# Altium schematic symbol library Hydra_Ref_sch.SCHLIB: 791 symbols (part 4 of 5)
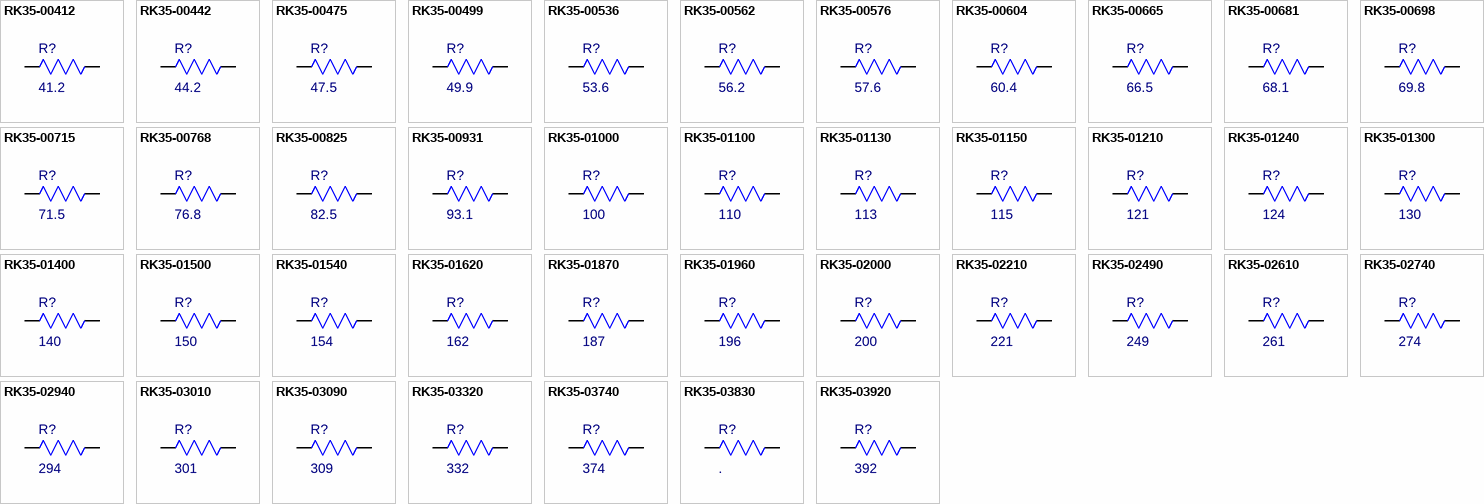
[diagram p25: symbols RK35-00412 to RK35-03920]

## RK35-02210
designator R?, comment value 221  (hidden comment: 221 OHMS; 1%; .1W; 100PPM; FILM; CHIP; 0402)
G_PN: RK35-02210; NoLoad: .; Approved: CL; MFGR: ANY; level: 1; ModifyDate: 2/28/13; M_PN: ANY; item_number: RK35-02210
footprint RES-0402-N (0402 Footprint)
pins: 1, 2

## RK35-02490
designator R?, comment value 249  (hidden comment: 249 OHMS; 1%; .1W; 100PPM; FILM; CHIP; 0402)
G_PN: RK35-02490; NoLoad: .; Approved: CL; MFGR: ANY; level: 1; ModifyDate: 02/22/12; M_PN: ANY; item_number: RK35-02490
footprint RES-0402-N (0402 Footprint)
pins: 1, 2

## RK35-02610
designator R?, comment value 261  (hidden comment: 261 OHMS; 1%; .1W; 100PPM; FILM; CHIP; 0402)
G_PN: RK35-02610; NoLoad: .; Approved: CL; MFGR: ANY; level: 1; ModifyDate: 02/13/13; M_PN: ANY; item_number: RK35-02610
footprint RES-0402-N (0402 Footprint)
pins: 1, 2

## RK35-02740
designator R?, comment value 274  (hidden comment: 274 OHMS; 1%; .1W; 100PPM; FILM; CHIP; 0402)
G_PN: RK35-02740; NoLoad: .; Approved: CL; MFGR: ANY; level: 1; ModifyDate: 6/28/13; M_PN: ANY; item_number: RK35-02740
footprint RES-0402-N (0402 Footprint)
pins: 1, 2

## RK35-02940
designator R?, comment value 294  (hidden comment: 294 OHMS; 1%; .1W; 100PPM; FILM; CHIP; 0402)
NoLoad: .; G_PN: RK35-02940; MFGR: ANY; Approved: CL; level: 1; ModifyDate: 02/22/12; M_PN: ANY; item_number: RK35-02940
footprint RES-0402-N (0402 Footprint)
pins: 1, 2

## RK35-03010
designator R?, comment value 301  (hidden comment: 301 OHMS; 1%; .1W; 100PPM; FILM; CHIP; 0402)
NoLoad: .; G_PN: RK35-03010; Approved: CL; MFGR: ANY; level: 1; ModifyDate: 4/12/12; M_PN: ANY; item_number: RK35-03010
footprint RES-0402-N (0402 Footprint)
pins: 1, 2

## RK35-03090
designator R?, comment value 309  (hidden comment: 309 OHMS; 1%; .1W; 100PPM; FILM; CHIP; 0402)
NoLoad: .; MFGR: ANY; Approved: CL; G_PN: RK35-03090; level: 1; ModifyDate: 02/22/12; M_PN: ANY; item_number: RK35-03090
footprint RES-0402-N (0402 Footprint)
pins: 1, 2

## RK35-03320
designator R?, comment value 332  (hidden comment: 332 OHMS; 1%; .1W; 100PPM; FILM; CHIP)
G_PN: RK35-03320; NoLoad: .; MFGR: ANY; Approved: CL; level: 1; ModifyDate: 4/9/12; M_PN: ANY; item_number: RK35-03320
footprint RES-0402-N (0402 Footprint)
pins: 1, 2

## RK35-03740
designator R?, comment value 374  (hidden comment: 374 OHMS; 1%; .1W; 100PPM; FILM; CHIP; 0402)
G_PN: RK35-03740; NoLoad: .; MFGR: ANY; Approved: CL; level: 1; ModifyDate: 4/11/12; M_PN: ANY; item_number: RK35-03740
footprint RES-0402-N (0402 Footprint)
pins: 1, 2

## RK35-03830
designator R?, comment NoLoad: .  (hidden comment: 383 OHMS; 1%; .1W; 100PPM; FILM; CHIP; 0402)
Value: 383; G_PN: RK35-03830; Approved: CL; MFGR: ANY; level: 1; ModifyDate: 4/11/12; M_PN: ANY; item_number: RK35-03830
footprint RES-0402-N (0402 Footprint)
pins: 1, 2

## RK35-03920
designator R?, comment value 392  (hidden comment: 392 OHMS; 1%; .1W; 100PPM; FILM; CHIP; 0402)
G_PN: RK35-03920; NoLoad: .; MFGR: ANY; Approved: CL; level: 1; ModifyDate: 02/22/12; M_PN: ANY; item_number: RK35-03920
footprint RES-0402-N (0402 Footprint)
pins: 1, 2

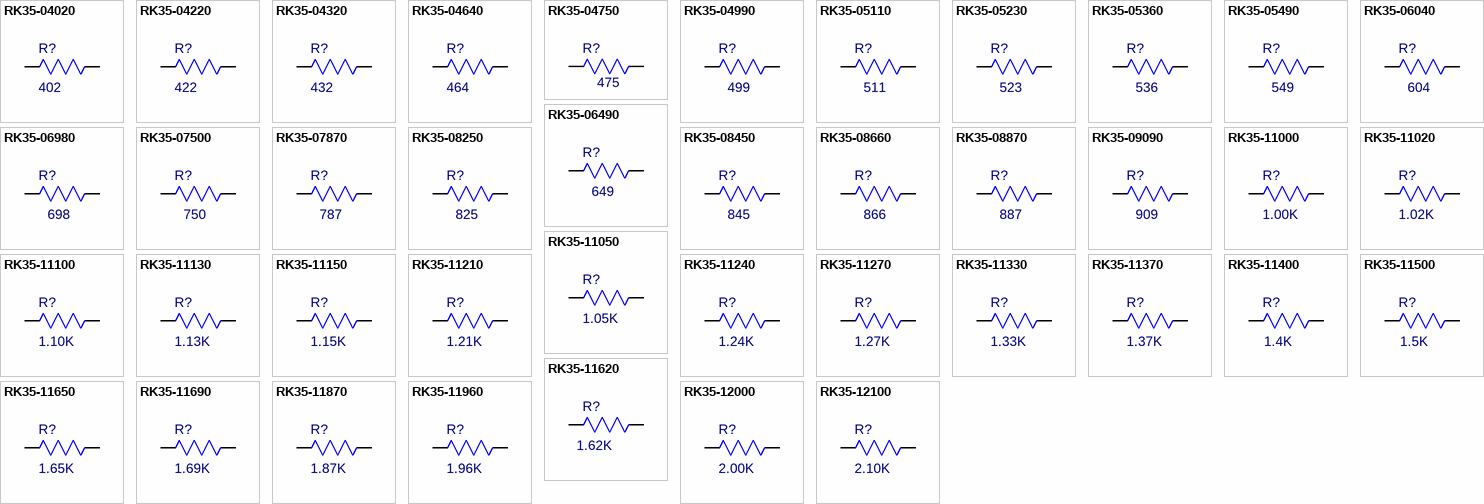
[diagram p14: symbols RK35-04020 to RK35-12100]

## RK35-04020
designator R?, comment value 402  (hidden comment: 402 OHMS; 1%; .1W; 100PPM; FILM; CHIP; 0402)
G_PN: RK35-04020; NoLoad: .; MFGR: ANY; Approved: CL; level: 1; ModifyDate: 4/11/12; M_PN: ANY; item_number: RK35-04020
footprint RES-0402-N (0402 Footprint)
pins: 1, 2

## RK35-04220
designator R?, comment value 422  (hidden comment: 422 OHMS; 1%; .1W; 100PPM; FILM; CHIP; 0402)
NoLoad: .; G_PN: RK35-04220; MFGR: ANY; Approved: CL; level: 1; ModifyDate: 02/22/12; M_PN: ANY; item_number: RK35-04220
footprint RES-0402-N (0402 Footprint)
pins: 1, 2

## RK35-04320
designator R?, comment value 432  (hidden comment: 432 OHMS; 1%; .1W; 100PPM; FILM; CHIP; 0402)
G_PN: RK35-04320; NoLoad: .; MFGR: ANY; Approved: CL; level: 1; ModifyDate: 02/22/12; M_PN: ANY; item_number: RK35-04320
footprint RES-0402-N (0402 Footprint)
pins: 1, 2

## RK35-04640
designator R?, comment value 464  (hidden comment: 464 OHMS; 1%; .1W; 100PPM; FILM; CHIP; 0402)
G_PN: RK35-04640; NoLoad: .; MFGR: ANY; Approved: CL; level: 1; ModifyDate: 4/26/13; M_PN: ANY; item_number: RK35-04640
footprint RES-0402-N (0402 Footprint)
pins: 1, 2

## RK35-04750
designator R?, comment value 475  (hidden comment: 475 OHMS; 1%; .1W; 100PPM; FILM; CHIP; 0402)
G_PN: RK35-04750; NoLoad: .; MFGR: ANY; Approved: CL; level: 1; ModifyDate: 02/22/12; M_PN: ANY; item_number: RK35-04750
footprint RES-0402-N (0402 Footprint)
pins: 1, 2

## RK35-04990
designator R?, comment value 499  (hidden comment: 499 OHMS; 1%; .1W; 100PPM; FILM; CHIP; 0402)
G_PN: RK35-04990; NoLoad: .; Approved: CL; MFGR: ANY; level: 1; ModifyDate: 02/22/12; M_PN: ANY; item_number: RK35-04990
footprint RES-0402-N (0402 Footprint)
pins: 1, 2

## RK35-05110
designator R?, comment value 511  (hidden comment: 511 OHMS; 1%; .1W; 100PPM; FILM; CHIP; 0402)
G_PN: RK35-05110; NoLoad: .; MFGR: ANY; Approved: CL; level: 1; ModifyDate: 4/23/13; M_PN: ANY; item_number: RK35-05110
footprint RES-0402-N (0402 Footprint)
pins: 1, 2

## RK35-05230
designator R?, comment value 523  (hidden comment: 523 OHMS; 1%; .1W; 100PPM; FILM; CHIP; 0402)
G_PN: RK35-05230; NoLoad: .; MFGR: ANY; Approved: CL; level: 1; ModifyDate: 2/13/13; M_PN: ANY; item_number: RK35-05230
footprint RES-0402-N (0402 Footprint)
pins: 1, 2

## RK35-05360
designator R?, comment value 536  (hidden comment: 536 OHMS; 1%; .1W; 100PPM; FILM; CHIP; 0402)
G_PN: RK35-05360; NoLoad: .; MFGR: ANY; Approved: CL; level: 1; ModifyDate: 9/28/15; M_PN: ANY; item_number: RK35-05360
footprint RES-0402-N (0402 Footprint)
pins: 1, 2

## RK35-05490
designator R?, comment value 549  (hidden comment: 549 OHMS; 1%; .1W; 100PPM; FILM; CHIP; 0402)
G_PN: RK35-05490; NoLoad: .; MFGR: ANY; Approved: CL; level: 1; ModifyDate: 5/7/12; M_PN: ANY; item_number: RK35-05490
footprint RES-0402-N (0402 Footprint)
pins: 1, 2

## RK35-06040
designator R?, comment value 604  (hidden comment: 604 OHMS; 1%; .1W; 100PPM; FILM; CHIP; 0402)
G_PN: RK35-06040; NoLoad: .; MFGR: ANY; Approved: CL; level: 1; ModifyDate: 4/23/13; M_PN: ANY; item_number: RK35-06040
footprint RES-0402-N (0402 Footprint)
pins: 1, 2

## RK35-06490
designator R?, comment value 649  (hidden comment: 649 OHMS; 1%; .1W; 100PPM; FILM; CHIP; 0402)
G_PN: RK35-06490; NoLoad: .; MFGR: ANY; Approved: CL; level: 1; ModifyDate: 9/5/14; M_PN: ANY; item_number: RK35-06490
footprint RES-0402-N (0402 Footprint)
pins: 1, 2

## RK35-06980
designator R?, comment value 698  (hidden comment: 698 OHMS; 1%; .1W; 100PPM; FILM; CHIP; 0402)
G_PN: RK35-06980; NoLoad: .; MFGR: ANY; Approved: CL; level: 1; ModifyDate: 02/22/12; M_PN: ANY; item_number: RK35-06980
footprint RES-0402-N (0402 Footprint)
pins: 1, 2

## RK35-07500
designator R?, comment value 750  (hidden comment: 750 OHMS;.1W;1%;100PPM;FILM CHIP;0402)
G_PN: RK35-07500; NoLoad: .; MFGR: ANY; Approved: CL; level: 1; M_PN: ANY; ModifyDate: 4/11/12; item_number: RK35-07500
footprint RES-0402-N (0402 Footprint)
pins: 1, 2

## RK35-07870
designator R?, comment value 787  (hidden comment: 787 OHMS;.1W;1%;100PPM;FILM CHIP;0402)
G_PN: RK35-07870; NoLoad: .; MFGR: ANY; Approved: CL; level: 1; M_PN: ANY; ModifyDate: 2/22/13; item_number: RK35-07870
footprint RES-0402-N (0402 Footprint)
pins: 1, 2

## RK35-08250
designator R?, comment value 825  (hidden comment: 825 OHMS; 1%; .1W; 100PPM; FILM; CHIP; 0402)
G_PN: RK35-08250; NoLoad: .; Approved: CL; MFGR: ANY; level: 1; ModifyDate: 02/22/12; M_PN: ANY; item_number: RK35-08250
footprint RES-0402-N (0402 Footprint)
pins: 1, 2

## RK35-08450
designator R?, comment value 845  (hidden comment: 845 OHMS; 1%; .1W; 100PPM; FILM; CHIP; 0402)
G_PN: RK35-08450; NoLoad: .; Approved: CL; MFGR: ANY; level: 1; ModifyDate: 4/23/13; M_PN: ANY; item_number: RK35-08450
footprint RES-0402-N (0402 Footprint)
pins: 1, 2

## RK35-08660
designator R?, comment value 866  (hidden comment: 866 OHMS; 1%; .1W; 100PPM; FILM; CHIP; 0402)
NoLoad: .; G_PN: RK35-08660; MFGR: ANY; Approved: CL; level: 1; ModifyDate: 02/22/12; M_PN: ANY; item_number: RK35-08660
footprint RES-0402-N (0402 Footprint)
pins: 1, 2

## RK35-08870
designator R?, comment value 887  (hidden comment: 887 OHMS; 1%; .1W; 100PPM; FILM; CHIP; 0402)
G_PN: RK35-08870; NoLoad: .; Approved: CL; MFGR: ANY; level: 1; ModifyDate: 02/22/12; M_PN: ANY; item_number: RK35-08870
footprint RES-0402-N (0402 Footprint)
pins: 1, 2

## RK35-09090
designator R?, comment value 909  (hidden comment: 909 OHMS; 1%; .1W; 100PPM; FILM; CHIP; 0402)
G_PN: RK35-09090; NoLoad: .; Approved: CL; MFGR: ANY; level: 1; ModifyDate: 3/25/13; M_PN: ANY; item_number: RK35-09090
footprint RES-0402-N (0402 Footprint)
pins: 1, 2

## RK35-11000
designator R?, comment value 1.00K  (hidden comment: 1.0K OHMS;.06W;1%;200PPM;FILM;CHIP;0402)
G_PN: RK35-11000; Approved: CL; NoLoad: .; MFGR: ANY; level: 1; ModifyDate: 02/22/12; M_PN: ANY; item_number: RK35-11000
footprint RES-0402-N (0402 Footprint)
pins: 1, 2

## RK35-11020
designator R?, comment value 1.02K  (hidden comment: 1.02K OHMS;.06W;1%;100PPM;FILM;CHIP;0402)
G_PN: RK35-11020; NoLoad: .; Approved: CL; MFGR: ANY; level: 1; ModifyDate: 5/9/13; M_PN: ANY; item_number: RK35-11020
footprint RES-0402-N (0402 Footprint)
pins: 1, 2

## RK35-11050
designator R?, comment value 1.05K  (hidden comment: 1.05K OHMS;.06W;1%;200PPM;FILM;CHIP;0402)
G_PN: RK35-11050; NoLoad: .; Approved: CL; MFGR: ANY; level: 1; ModifyDate: 03/14/13; M_PN: ANY; item_number: RK35-11050
footprint RES-0402-N (0402 Footprint)
pins: 1, 2

## RK35-11100
designator R?, comment value 1.10K  (hidden comment: 1.10K OHMS;.06W;1%;100PPM;FILM;CHIP;0402)
G_PN: RK35-11100; NoLoad: .; Approved: CL; MFGR: ANY; level: 1; ModifyDate: 5/13/13; M_PN: ANY; item_number: RK35-11100
footprint RES-0402-N (0402 Footprint)
pins: 1, 2

## RK35-11130
designator R?, comment value 1.13K  (hidden comment: 1.13K OHMS;.06W;1%;200PPM;FILM;CHIP;0402)
G_PN: RK35-11130; NoLoad: .; Approved: CL; MFGR: ANY; level: 1; ModifyDate: 5/8/13; M_PN: ANY; item_number: RK35-11130
footprint RES-0402-N (0402 Footprint)
pins: 1, 2

## RK35-11150
designator R?, comment value 1.15K  (hidden comment: 1.15K OHMS;.06W;1%;200PPM;FILM;CHIP;0402)
G_PN: RK35-11150; NoLoad: .; Approved: CL; MFGR: ANY; level: 1; ModifyDate: 5/8/13; M_PN: ANY; item_number: RK35-11150
footprint RES-0402-N (0402 Footprint)
pins: 1, 2

## RK35-11210
designator R?, comment value 1.21K  (hidden comment: 1.21K OHMS;.06W;1%;200PPM;FILM;CHIP;0402)
G_PN: RK35-11210; NoLoad: .; Approved: CL; MFGR: ANY; level: 1; ModifyDate: 02/22/13; M_PN: ANY; item_number: RK35-11210
footprint RES-0402-N (0402 Footprint)
pins: 1, 2

## RK35-11240
designator R?, comment value 1.24K  (hidden comment: 1.24K Ohms;.06W;1%;±100PPM;CHIP RES;0402)
G_PN: RK35-11240; NoLoad: .; Approved: CL; MFGR: ANY; level: 1; ModifyDate: 5/8/13; M_PN: ANY; item_number: RK35-11240
footprint RES-0402-N (0402 Footprint)
pins: 1, 2

## RK35-11270
designator R?, comment value 1.27K  (hidden comment: 1.27K OHMS;.06W;1%;200PPM;FILM;CHIP;0402)
G_PN: RK35-11270; NoLoad: .; Approved: CL; MFGR: ANY; level: 1; ModifyDate: 02/22/13; M_PN: ANY; item_number: RK35-11270
footprint RES-0402-N (0402 Footprint)
pins: 1, 2

## RK35-11330
designator R?, comment value 1.33K  (hidden comment: 1.33K OHMS;.06W;1%;200PPM;FILM;CHIP;0402)
G_PN: RK35-11330; NoLoad: .; Approved: CL; MFGR: ANY; level: 1; ModifyDate: 02/22/12; M_PN: ANY; item_number: RK35-11330
footprint RES-0402-N (0402 Footprint)
pins: 1, 2

## RK35-11370
designator R?, comment value 1.37K  (hidden comment: 1.37K OHMS;.06W;1%;200PPM;FILM;CHIP;0402)
G_PN: RK35-11370; NoLoad: .; Approved: CL; MFGR: ANY; level: 1; ModifyDate: 02/04/13; M_PN: ANY; item_number: RK35-11370
footprint RES-0402-N (0402 Footprint)
pins: 1, 2

## RK35-11400
designator R?, comment value 1.4K  (hidden comment: 1.40K Ohms;.06W;1%;±100PPM;CHIP RES;0402)
G_PN: RK35-11400; Approved: CL; NoLoad: .; MFGR: ANY; level: 1; ModifyDate: 5/8/13; M_PN: ANY; item_number: RK35-11400
footprint RES-0402-N (0402 Footprint)
pins: 1, 2

## RK35-11500
designator R?, comment value 1.5K  (hidden comment: 1.50K Ohms;.06W;1%;±100PPM;CHIP RES;0402)
G_PN: RK35-11500; Approved: CL; NoLoad: .; MFGR: ANY; level: 1; ModifyDate: 4/11/12; M_PN: ANY; item_number: RK35-11500
footprint RES-0402-N (0402 Footprint)
pins: 1, 2

## RK35-11620
designator R?, comment value 1.62K  (hidden comment: 1.62K Ohms;.06W;1%;±100PPM;CHIP RES;0402)
G_PN: RK35-11620; Approved: CL; NoLoad: .; MFGR: ANY; level: 1; ModifyDate: 02/22/12; M_PN: ANY; item_number: RK35-11620
footprint RES-0402-N (0402 Footprint)
pins: 1, 2

## RK35-11650
designator R?, comment value 1.65K  (hidden comment: 1.65K Ohms;.06W;1%;±100PPM;CHIP RES;0402)
G_PN: RK35-11650; Approved: CL; NoLoad: .; MFGR: ANY; level: 1; ModifyDate: 5/14/12; M_PN: ANY; item_number: RK35-11650
footprint RES-0402-N (0402 Footprint)
pins: 1, 2

## RK35-11690
designator R?, comment value 1.69K  (hidden comment: 1.69K Ohms;.06W;1%;±100PPM;CHIP RES;0402)
G_PN: RK35-11690; Approved: CL; NoLoad: .; MFGR: ANY; level: 1; ModifyDate: 5/13/13; M_PN: ANY; item_number: RK35-11690
footprint RES-0402-N (0402 Footprint)
pins: 1, 2

## RK35-11870
designator R?, comment value 1.87K  (hidden comment: 1.87K Ohms;.06W;1%;±100PPM;CHIP RES;0402)
G_PN: RK35-11870; Approved: CL; NoLoad: .; MFGR: ANY; level: 1; ModifyDate: 5/13/13; M_PN: ANY; item_number: RK35-11870
footprint RES-0402-N (0402 Footprint)
pins: 1, 2

## RK35-11960
designator R?, comment value 1.96K  (hidden comment: 1.96K Ohms;.06W;1%;±100PPM;CHIP RES;0402)
G_PN: RK35-11960; Approved: CL; NoLoad: .; MFGR: ANY; level: 1; ModifyDate: 5/8/13; M_PN: ANY; item_number: RK35-11960
footprint RES-0402-N (0402 Footprint)
pins: 1, 2

## RK35-12000
designator R?, comment value 2.00K  (hidden comment: 2.00K OHMS;.06W;1%;200PPM;FILM;CHIP;0402)
G_PN: RK35-12000; NoLoad: .; MFGR: ANY; Approved: CL; level: 1; ModifyDate: 02/22/12; M_PN: ANY; item_number: RK35-12000
footprint RES-0402-N (0402 Footprint)
pins: 1, 2

## RK35-12100
designator R?, comment value 2.10K  (hidden comment: 2.10K OHMS;.06W;1%;100PPM;FILM;CHIP;0402)
G_PN: RK35-12100; NoLoad: .; MFGR: ANY; Approved: CL; level: 1; ModifyDate: 5/7/12; M_PN: ANY; item_number: RK35-12100
footprint RES-0402-N (0402 Footprint)
pins: 1, 2

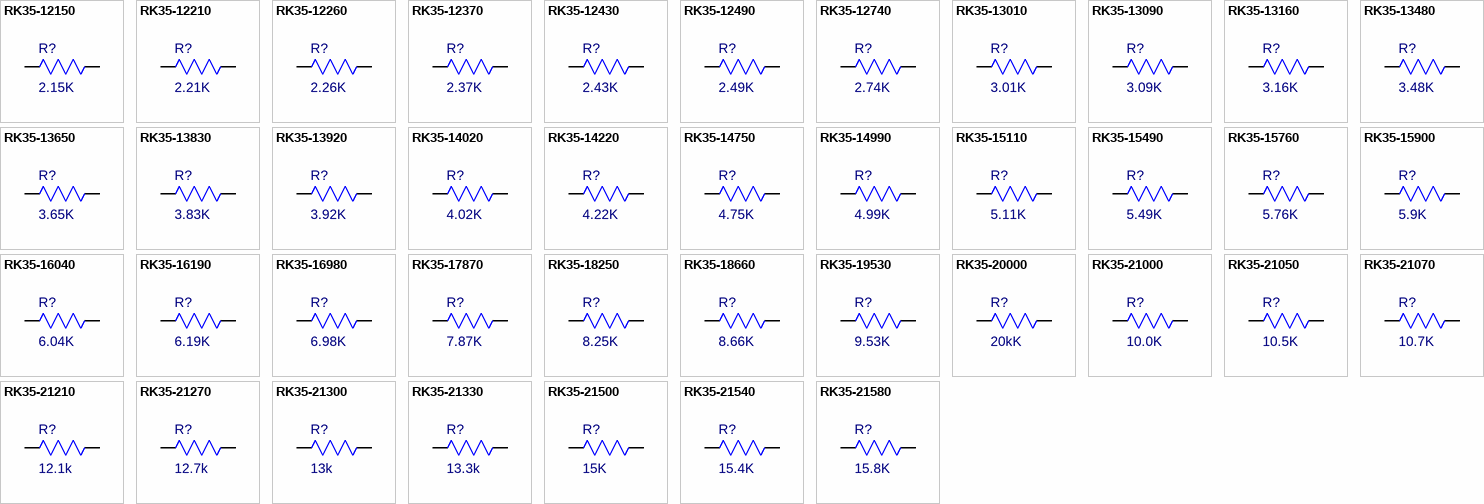
[diagram p15: symbols RK35-12150 to RK35-21580]

## RK35-12150
designator R?, comment value 2.15K  (hidden comment: 2.15K OHMS;.06W;1%;200PPM;FILM;CHIP;0402)
G_PN: RK35-12150; NoLoad: .; MFGR: ANY; Approved: CL; level: 1; ModifyDate: 5/7/12; M_PN: ANY; item_number: RK35-12150
footprint RES-0402-N (0402 Footprint)
pins: 1, 2

## RK35-12210
designator R?, comment value 2.21K  (hidden comment: 2.21K OHMS;.06W;1%;200PPM;FILM;CHIP;0402)
G_PN: RK35-12210; NoLoad: .; MFGR: ANY; Approved: CL; level: 1; ModifyDate: 2/22/13; M_PN: ANY; item_number: RK35-12210
footprint RES-0402-N (0402 Footprint)
pins: 1, 2

## RK35-12260
designator R?, comment value 2.26K  (hidden comment: 2.26K OHMS;.06W;1%;200PPM;FILM;CHIP;0402)
G_PN: RK35-12260; NoLoad: .; MFGR: ANY; Approved: CL; level: 1; ModifyDate: 5/8/13; M_PN: ANY; item_number: RK35-12260
footprint RES-0402-N (0402 Footprint)
pins: 1, 2

## RK35-12370
designator R?, comment value 2.37K  (hidden comment: 2.37K OHMS;.06W;1%;200PPM;FILM;CHIP;0402)
G_PN: RK35-12370; NoLoad: .; MFGR: ANY; Approved: CL; level: 1; ModifyDate: 02/23/13; M_PN: ANY; item_number: RK35-12370
footprint RES-0402-N (0402 Footprint)
pins: 1, 2

## RK35-12430
designator R?, comment value 2.43K  (hidden comment: 2.43K OHMS;.06W;1%;200PPM;FILM;CHIP;0402)
G_PN: RK35-12430; NoLoad: .; MFGR: ANY; Approved: CL; level: 1; ModifyDate: 5/8/13; M_PN: ANY; item_number: RK35-12430
footprint RES-0402-N (0402 Footprint)
pins: 1, 2

## RK35-12490
designator R?, comment value 2.49K  (hidden comment: 2.49K OHMS;.06W;1%;200PPM;FILM;CHIP;0402)
G_PN: RK35-12490; NoLoad: .; MFGR: ANY; Approved: CL; level: 1; ModifyDate: 02/22/12; M_PN: ANY; item_number: RK35-12490
footprint RES-0402-N (0402 Footprint)
pins: 1, 2

## RK35-12740
designator R?, comment value 2.74K  (hidden comment: 2.74K OHMS;.06W;1%;100PPM;FILM;CHIP;0402)
G_PN: RK35-12740; NoLoad: .; MFGR: ANY; Approved: CL; level: 1; ModifyDate: 5/10/13; M_PN: ANY; item_number: RK35-12740
footprint RES-0402-N (0402 Footprint)
pins: 1, 2

## RK35-13010
designator R?, comment value 3.01K  (hidden comment: 3.01K OHMS;.06W;1%;200PPM;FILM;CHIP;0402)
G_PN: RK35-13010; Approved: CL; NoLoad: .; MFGR: ANY; level: 1; ModifyDate: 02/22/12; M_PN: ANY; item_number: RK35-13010
footprint RES-0402-N (0402 Footprint)
pins: 1, 2

## RK35-13090
designator R?, comment value 3.09K  (hidden comment: 3.09K OHMS;.06W;1%;200PPM;FILM;CHIP;0402)
G_PN: RK35-13090; Approved: CL; NoLoad: .; MFGR: ANY; level: 1; ModifyDate: 4/25/13; M_PN: ANY; item_number: RK35-13090
footprint RES-0402-N (0402 Footprint)
pins: 1, 2

## RK35-13160
designator R?, comment value 3.16K  (hidden comment: 3.16K OHMS;.06W;1%;200PPM;FILM;CHIP;0402)
G_PN: RK35-13160; Approved: CL; NoLoad: .; MFGR: ANY; level: 1; ModifyDate: 02/26/13; M_PN: ANY; item_number: RK35-13160
footprint RES-0402-N (0402 Footprint)
pins: 1, 2

## RK35-13480
designator R?, comment value 3.48K  (hidden comment: 3.48K OHMS;.06W;1%;200PPM;FILM;CHIP;0402)
G_PN: RK35-13480; Approved: CL; NoLoad: .; MFGR: ANY; level: 1; ModifyDate: 02/22/12; M_PN: ANY; item_number: RK35-13480
footprint RES-0402-N (0402 Footprint)
pins: 1, 2

## RK35-13650
designator R?, comment value 3.65K  (hidden comment: 3.65K OHMS;.06W;1%;200PPM;FILM;CHIP;0402)
G_PN: RK35-13650; Approved: CL; NoLoad: .; MFGR: ANY; level: 1; ModifyDate: 02/22/12; M_PN: ANY; item_number: RK35-13650
footprint RES-0402-N (0402 Footprint)
pins: 1, 2

## RK35-13830
designator R?, comment value 3.83K  (hidden comment: 3.83K OHMS;.06W;1%;100PPM;FILM;CHIP;0402)
G_PN: RK35-13830; NoLoad: .; MFGR: ANY; Approved: CL; level: 1; ModifyDate: 5/10/13; M_PN: ANY; item_number: RK35-13830
footprint RES-0402-N (0402 Footprint)
pins: 1, 2

## RK35-13920
designator R?, comment value 3.92K  (hidden comment: 3.92K OHMS;.06W;1%;200PPM;FILM;CHIP;0402)
G_PN: RK35-13920; NoLoad: .; MFGR: ANY; Approved: CL; level: 1; ModifyDate: 4/11/12; M_PN: ANY; item_number: RK35-13920
footprint RES-0402-N (0402 Footprint)
pins: 1, 2

## RK35-14020
designator R?, comment value 4.02K  (hidden comment: 4.02 K OHMS;.06W;1%;200PPM;FILM;CHIP;0402)
G_PN: RK35-14020; NoLoad: .; MFGR: ANY; Approved: CL; level: 1; ModifyDate: 3/5/13; M_PN: ANY; item_number: RK35-14020
footprint RES-0402-N (0402 Footprint)
pins: 1, 2

## RK35-14220
designator R?, comment value 4.22K  (hidden comment: 4.22K OHMS;.06W;1%;200PPM;FILM;CHIP;0402)
G_PN: RK35-14220; NoLoad: .; Approved: CL; MFGR: ANY; level: 1; ModifyDate: 02/26/13; M_PN: ANY; item_number: RK35-14220
footprint RES-0402-N (0402 Footprint)
pins: 1, 2

## RK35-14750
designator R?, comment value 4.75K  (hidden comment: 4.75K OHMS;.06W;1%;200PPM;FILM;CHIP;0402)
G_PN: RK35-14750; NoLoad: .; Approved: CL; MFGR: ANY; level: 1; ModifyDate: 02/22/12; M_PN: ANY; item_number: RK35-14750
footprint RES-0402-N (0402 Footprint)
pins: 1, 2

## RK35-14990
designator R?, comment value 4.99K  (hidden comment: 4.99K OHMS;.06W;1%;200PPM;FILM;CHIP;0402)
G_PN: RK35-14990; Approved: CL; NoLoad: .; MFGR: ANY; level: 1; ModifyDate: 4/11/12; M_PN: ANY; item_number: RK35-14990
footprint RES-0402-N (0402 Footprint)
pins: 1, 2

## RK35-15110
designator R?, comment value 5.11K  (hidden comment: 5.11K Ohms;.06W;1%;±100PPM;CHIP RES;0402)
G_PN: RK35-15110; NoLoad: .; Approved: CL; MFGR: ANY; level: 1; ModifyDate: 02/04/12; M_PN: ANY; item_number: RK35-15110
footprint RES-0402-N (0402 Footprint)
pins: 1, 2

## RK35-15490
designator R?, comment value 5.49K  (hidden comment: 5.49K OHMS;.06W;1%;100PPM;FILM;CHIP;0402)
G_PN: RK35-15490; NoLoad: .; Approved: CL; MFGR: ANY; level: 1; ModifyDate: 5/9/14; M_PN: ANY; item_number: RK35-15490
footprint RES-0402-N (0402 Footprint)
pins: 1, 2

## RK35-15760
designator R?, comment value 5.76K  (hidden comment: 5.76K OHMS;.06W;1%;200PPM;FILM;CHIP;0402)
G_PN: RK35-15760; NoLoad: .; Approved: CL; MFGR: ANY; level: 1; ModifyDate: 02/04/12; M_PN: ANY; item_number: RK35-15760
footprint RES-0402-N (0402 Footprint)
pins: 1, 2

## RK35-15900
designator R?, comment value 5.9K  (hidden comment: 5.9K OHMS;.06W;1%;200PPM;FILM;CHIP;0402)
G_PN: RK35-15900; NoLoad: .; Approved: CL; MFGR: ANY; level: 1; ModifyDate: 02/22/12; M_PN: ANY; item_number: RK35-15900
footprint RES-0402-N (0402 Footprint)
pins: 1, 2

## RK35-16040
designator R?, comment value 6.04K  (hidden comment: 6.04K OHMS;.06W;1%;200PPM;FILM;CHIP;0402)
G_PN: RK35-16040; Approved: CL; NoLoad: .; MFGR: ANY; level: 1; ModifyDate: 4/11/12; M_PN: ANY; item_number: RK35-16040
footprint RES-0402-N (0402 Footprint)
pins: 1, 2

## RK35-16190
designator R?, comment value 6.19K  (hidden comment: 6.19K OHMS;.06W;1%;200PPM;FILM;CHIP;0402)
G_PN: RK35-16190; NoLoad: .; Approved: CL; MFGR: ANY; level: 1; ModifyDate: 02/22/12; M_PN: ANY; item_number: RK35-16190
footprint RES-0402-N (0402 Footprint)
pins: 1, 2

## RK35-16980
designator R?, comment value 6.98K  (hidden comment: 6.98K OHMS;.06W;1%;100PPM;FILM;CHIP;0402)
G_PN: RK35-16980; NoLoad: .; Approved: CL; MFGR: ANY; level: 1; ModifyDate: 5/15/13; M_PN: ANY; item_number: RK35-16980
footprint RES-0402-N (0402 Footprint)
pins: 1, 2

## RK35-17870
designator R?, comment value 7.87K  (hidden comment: 7.87K OHMS;.06W;1%;100PPM;FILM;CHIP;0402)
G_PN: RK35-17870; NoLoad: .; Approved: CL; MFGR: ANY; level: 1; ModifyDate: 9/28/15; M_PN: ANY; item_number: RK35-17870
footprint RES-0402-N (0402 Footprint)
pins: 1, 2

## RK35-18250
designator R?, comment value 8.25K  (hidden comment: 8.25K OHMS;.06W;1%;200PPM;FILM;CHIP;0402)
G_PN: RK35-18250; Approved: CL; NoLoad: .; MFGR: ANY; level: 1; ModifyDate: 4/11/12; M_PN: ANY; item_number: RK35-18250
footprint RES-0402-N (0402 Footprint)
pins: 1, 2

## RK35-18660
designator R?, comment value 8.66K  (hidden comment: 8.66K OHMS;.06W;1%;200PPM;FILM;CHIP;0402)
G_PN: RK35-18660; Approved: CL; NoLoad: .; MFGR: ANY; level: 1; ModifyDate: 6/10/13; M_PN: ANY; item_number: RK35-18660
footprint RES-0402-N (0402 Footprint)
pins: 1, 2

## RK35-19530
designator R?, comment value 9.53K  (hidden comment: 9.53K OHMS;.06W;1%;200PPM;FILM;CHIP;0402)
G_PN: RK35-19530; NoLoad: .; Approved: CL; MFGR: ANY; level: 1; ModifyDate: 02/22/12; M_PN: ANY; item_number: RK35-19530
footprint RES-0402-N (0402 Footprint)
pins: 1, 2

## RK35-20000
designator R?, comment value 20kK  (hidden comment: 18.2K OHMS;.06W;1%;100PPM;FILM;CHIP;0402)
G_PN: RK35-20000; Approved: CL; NoLoad: .; MFGR: ANY; level: 1; ModifyDate: 6/6/13; M_PN: ANY; item_number: RK35-20000
footprint RES-0402-N (0402 Footprint)
pins: 1, 2

## RK35-21000
designator R?, comment value 10.0K  (hidden comment: 10.0K OHMS;.06W;1%;200PPM;FILM;CHIP;0402)
G_PN: RK35-21000; Approved: CL; NoLoad: .; MFGR: ANY; level: 1; ModifyDate: 02/22/12; M_PN: ANY; item_number: RK35-21000
footprint RES-0402-N (0402 Footprint)
pins: 1, 2

## RK35-21050
designator R?, comment value 10.5K  (hidden comment: 10.5K OHMS;.06W;1%;200PPM;FILM;CHIP;0402)
G_PN: RK35-21050; Approved: CL; NoLoad: .; MFGR: ANY; level: 1; ModifyDate: 5/6/13; M_PN: ANY; item_number: RK35-21050
footprint RES-0402-N (0402 Footprint)
pins: 1, 2

## RK35-21070
designator R?, comment value 10.7K  (hidden comment: 10.7K OHMS;.06W;1%;100PPM;FILM;CHIP;0402)
G_PN: RK35-21070; Approved: CL; NoLoad: .; MFGR: ANY; level: 1; ModifyDate: 6/10/13; M_PN: ANY; item_number: RK35-21070
footprint RES-0402-N (0402 Footprint)
pins: 1, 2

## RK35-21210
designator R?, comment value 12.1k  (hidden comment: 12.1K OHMS;.06W;1%;200PPM;FILM;CHIP;0402)
G_PN: RK35-21210; Approved: CL; NoLoad: .; MFGR: ANY; level: 1; ModifyDate: 4/26/13; M_PN: ANY; item_number: RK35-21210
footprint RES-0402-N (0402 Footprint)
pins: 1, 2

## RK35-21270
designator R?, comment value 12.7k  (hidden comment: 12.7K OHMS;.06W;1%;200PPM;FILM;CHIP;0402)
G_PN: RK35-21270; Approved: CL; NoLoad: .; MFGR: ANY; level: 1; ModifyDate: 4/23/13; M_PN: ANY; item_number: RK35-21270
footprint RES-0402-N (0402 Footprint)
pins: 1, 2

## RK35-21300
designator R?, comment value 13k  (hidden comment: 13K OHMS;.06W;1%;200PPM;FILM;CHIP;0402)
G_PN: RK35-21300; Approved: CL; NoLoad: .; MFGR: ANY; level: 1; ModifyDate: 4/23/13; M_PN: ANY; item_number: RK35-21300
footprint RES-0402-N (0402 Footprint)
pins: 1, 2

## RK35-21330
designator R?, comment value 13.3k  (hidden comment: 13.3K OHMS;.06W;1%;200PPM;FILM;CHIP;0402)
G_PN: RK35-21330; Approved: CL; NoLoad: .; MFGR: ANY; level: 1; ModifyDate: 4/30/13; M_PN: ANY; item_number: RK35-21330
footprint RES-0402-N (0402 Footprint)
pins: 1, 2

## RK35-21500
designator R?, comment value 15K  (hidden comment: 15K OHMS;.06W;1%;200PPM;FILM;CHIP;0402)
G_PN: RK35-21500; Approved: CL; NoLoad: .; MFGR: ANY; level: 1; ModifyDate: 02/26/13; M_PN: ANY; item_number: RK35-21500
footprint RES-0402-N (0402 Footprint)
pins: 1, 2

## RK35-21540
designator R?, comment value 15.4K  (hidden comment: 15.4K OHMS;.06W;1%;200PPM;FILM;CHIP;0402)
G_PN: RK35-21540; Approved: CL; NoLoad: .; MFGR: ANY; level: 1; ModifyDate: 02/26/13; M_PN: ANY; item_number: RK35-21540
footprint RES-0402-N (0402 Footprint)
pins: 1, 2

## RK35-21580
designator R?, comment value 15.8K  (hidden comment: 15.8K OHMS;.06W;1%;200PPM;FILM;CHIP;0402)
G_PN: RK35-21580; Approved: CL; NoLoad: .; MFGR: ANY; level: 1; ModifyDate: 5/6/13; M_PN: ANY; item_number: RK35-21580
footprint RES-0402-N (0402 Footprint)
pins: 1, 2

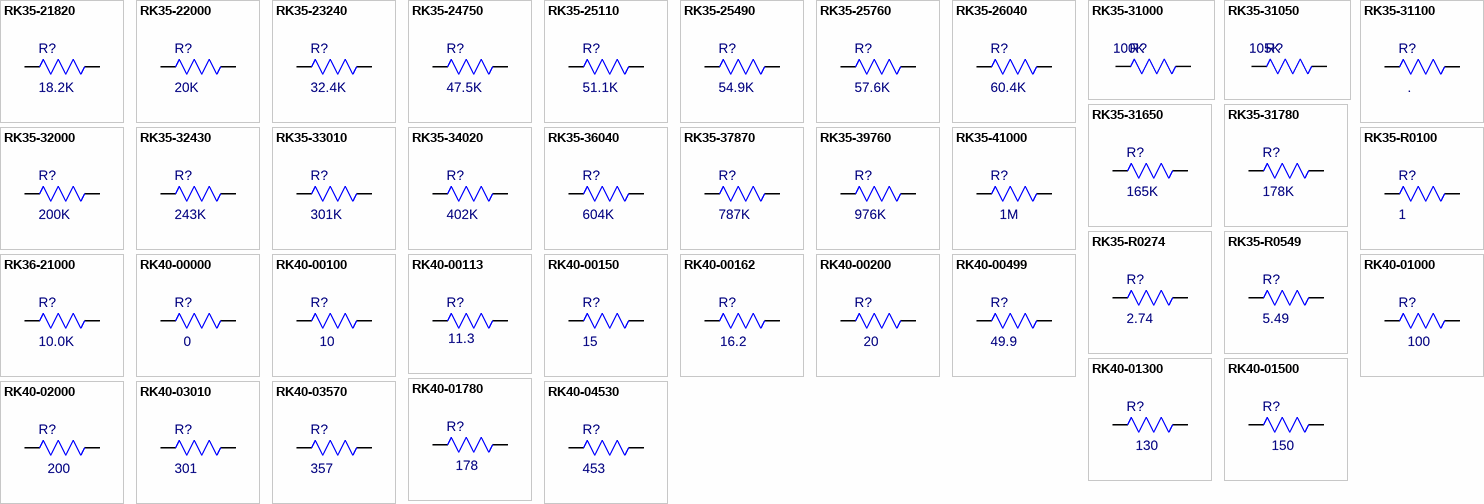
[diagram p16: symbols RK35-21820 to RK40-04530]

## RK35-21820
designator R?, comment value 18.2K  (hidden comment: 18.2K OHMS;.06W;1%;200PPM;FILM;CHIP;0402)
G_PN: RK35-21820; Approved: CL; NoLoad: .; MFGR: ANY; level: 1; ModifyDate: 5/6/13; M_PN: ANY; item_number: RK35-21820
footprint RES-0402-N (0402 Footprint)
pins: 1, 2

## RK35-22000
designator R?, comment value 20K  (hidden comment: 20K OHMS;.06W;1%;100PPM;FILM;CHIP;0402)
G_PN: RK35-22000; Approved: CL; NoLoad: .; MFGR: ANY; level: 1; ModifyDate: 6/6/13; M_PN: ANY; item_number: RK35-22000
footprint RES-0402-N (0402 Footprint)
pins: 1, 2

## RK35-23240
designator R?, comment value 32.4K  (hidden comment: 32.4K OHMS;.06W;1%;200PPM;FILM;CHIP;0402)
G_PN: RK35-23240; NoLoad: .; Approved: CL; M_PN: ANY; level: 1; ModifyDate: 02/04/13; MFGR: ANY; item_number: RK35-23240
footprint RES-0402-N (0402 Footprint)
pins: 1, 2

## RK35-24750
designator R?, comment value 47.5K  (hidden comment: 47.5K OHMS;.06W;1%;200PPM;FILM;CHIP;0402)
G_PN: RK35-24750; NoLoad: .; Approved: CL; M_PN: ANY; level: 1; ModifyDate: 02/04/13; MFGR: ANY; item_number: RK35-24750
footprint RES-0402-N (0402 Footprint)
pins: 1, 2

## RK35-25110
designator R?, comment value 51.1K  (hidden comment: 51.1K OHMS;.06W;1%;100PPM;FILM;CHIP;0402)
G_PN: RK35-25110; NoLoad: .; Approved: CL; M_PN: ANY; level: 1; ModifyDate: 5/14/13; MFGR: ANY; item_number: RK35-25110
footprint RES-0402-N (0402 Footprint)
pins: 1, 2

## RK35-25490
designator R?, comment value 54.9K  (hidden comment: 54.9K OHMS;.06W;1%;200PPM;FILM;CHIP;0402)
G_PN: RK35-25490; NoLoad: .; Approved: CL; M_PN: ANY; level: 1; ModifyDate: 02/22/12; MFGR: ANY; item_number: RK35-25490
footprint RES-0402-N (0402 Footprint)
pins: 1, 2

## RK35-25760
designator R?, comment value 57.6K  (hidden comment: 57.6K OHMS;.06W;1%;200PPM;FILM;CHIP;0402)
G_PN: RK35-25760; NoLoad: .; Approved: CL; M_PN: ANY; level: 1; ModifyDate: 4/29/13; MFGR: ANY; item_number: RK35-25760
footprint RES-0402-N (0402 Footprint)
pins: 1, 2

## RK35-26040
designator R?, comment value 60.4K  (hidden comment: 60.4K OHMS;.06W;1%;200PPM;FILM;CHIP;0402)
G_PN: RK35-26040; Approved: CL; NoLoad: .; MFGR: ANY; level: 1; ModifyDate: 02/22/12; M_PN: ANY; item_number: RK35-26040
footprint RES-0402-N (0402 Footprint)
pins: 1, 2

## RK35-31000
designator R?, comment value 100K  (hidden comment: 100K OHMS;.06W;1%;200PPM;FILM;CHIP;0402)
G_PN: RK35-31000; Approved: CL; M_PN: ANY; NoLoad: .; level: 1; ModifyDate: 4/29/13; MFGR: ANY; item_number: RK35-31000
footprint RES-0402-N (0402 Footprint)
pins: 1, 2

## RK35-31050
designator R?, comment value 105K  (hidden comment: 105K OHMS;.06W;1%;200PPM;FILM;CHIP;0402)
Approved: CL; M_PN: ANY; NoLoad: .; G_PN: RK35-31050; level: 1; ModifyDate: 5/6/13; MFGR: ANY; item_number: RK35-31050
footprint RES-0402-N (0402 Footprint)
pins: 1, 2

## RK35-31100
designator R?, comment NoLoad: .  (hidden comment: 110K OHMS;.06W;1%;200PPM;FILM;CHIP;0402)
G_PN: RK35-31100; Approved: CL; M_PN: ANY; level: 1; Value: 110K; ModifyDate: 4/11/12; MFGR: ANY; item_number: RK35-31100
footprint RES-0402-N (0402 Footprint)
pins: 1, 2

## RK35-31650
designator R?, comment value 165K  (hidden comment: 165K OHMS;.06W;1%;200PPM;FILM;CHIP;0402)
G_PN: RK35-31650; NoLoad: .; Approved: CL; M_PN: ANY; level: 1; ModifyDate: 4/29/13; MFGR: ANY; item_number: RK35-31650
footprint RES-0402-N (0402 Footprint)
pins: 1, 2

## RK35-31780
designator R?, comment value 178K  (hidden comment: 178K OHMS;.06W;1%;200PPM;FILM;CHIP;0402)
G_PN: RK35-31780; NoLoad: .; Approved: CL; M_PN: ANY; level: 1; ModifyDate: 4/30/13; MFGR: ANY; item_number: RK35-31780
footprint RES-0402-N (0402 Footprint)
pins: 1, 2

## RK35-32000
designator R?, comment value 200K  (hidden comment: 200K OHMS;.06W;1%;200PPM;FILM;CHIP;0402)
G_PN: RK35-32000; NoLoad: .; Approved: CL; M_PN: ANY; level: 1; ModifyDate: 4/11/12; MFGR: ANY; item_number: RK35-32000
footprint RES-0402-N (0402 Footprint)
pins: 1, 2

## RK35-32430
designator R?, comment value 243K  (hidden comment: 243K OHMS;.06W;1%;200PPM;FILM;CHIP;0402)
G_PN: RK35-32430; NoLoad: .; Approved: CL; M_PN: ANY; level: 1; ModifyDate: 5/13/13; MFGR: ANY; item_number: RK35-32430
footprint RES-0402-N (0402 Footprint)
pins: 1, 2

## RK35-33010
designator R?, comment value 301K  (hidden comment: 301K OHMS;.06W;1%;100PPM;FILM;CHIP;0402)
Approved: CL; G_PN: RK35-33010; NoLoad: .; M_PN: ANY; level: 1; ModifyDate: 5/13/13; MFGR: ANY; item_number: RK35-33010
footprint RES-0402-N (0402 Footprint)
pins: 1, 2

## RK35-34020
designator R?, comment value 402K  (hidden comment: 402K OHMS;.06W;1%;200PPM;FILM;CHIP;0402)
Approved: CL; G_PN: RK35-34020; NoLoad: .; M_PN: ANY; level: 1; ModifyDate: 4/11/12; MFGR: ANY; item_number: RK35-34020
footprint RES-0402-N (0402 Footprint)
pins: 1, 2

## RK35-36040
designator R?, comment value 604K  (hidden comment: 604K OHMS;.06W;1%;200PPM;FILM;CHIP;0402)
Approved: CL; G_PN: RK35-36040; NoLoad: .; M_PN: ANY; level: 1; ModifyDate: 2/04/13; MFGR: ANY; item_number: RK35-36040
footprint RES-0402-N (0402 Footprint)
pins: 1, 2

## RK35-37870
designator R?, comment value 787K  (hidden comment: 787K OHMS;.06W;1%;200PPM;FILM;CHIP;0402)
Approved: CL; G_PN: RK35-37870; NoLoad: .; M_PN: ANY; level: 1; ModifyDate: 5/1/12; MFGR: ANY; item_number: RK35-37870
footprint RES-0402-N (0402 Footprint)
pins: 1, 2

## RK35-39760
designator R?, comment value 976K  (hidden comment: 976K OHMS;.06W;1%;200PPM;FILM;CHIP;0402)
Approved: CL; G_PN: RK35-39760; NoLoad: .; M_PN: ANY; level: 1; ModifyDate: 5/1/12; MFGR: ANY; item_number: RK35-39760
footprint RES-0402-N (0402 Footprint)
pins: 1, 2

## RK35-41000
designator R?, comment value 1M  (hidden comment: 1M OHM;.06W;1%;200PPM;FILM;CHIP;0402)
Approved: CL; G_PN: RK35-41000; NoLoad: .; M_PN: ANY; level: 1; ModifyDate: 5/8/12; MFGR: ANY; item_number: RK35-41000
footprint RES-0402-N (0402 Footprint)
pins: 1, 2

## RK35-R0100
designator R?, comment value 1  (hidden comment: 1.00 Ohms;.06W;1%;±200PPM;CHIP RES;0402)
G_PN: RK35-R0100; NoLoad: .; Approved: CL; M_PN: CR0402-16W-1R00FT; MFGR: VENKEL; ModifyDate: 5/2/13; item_number: RK35-R0100; level: 1
footprint RES-0402-N (0402 Footprint)
pins: 1, 2

## RK35-R0274
designator R?, comment value 2.74  (hidden comment: 2.74 OHMS;.06W;1%;200PPM;FILM;CHIP;0402)
G_PN: RK35-R0274; NoLoad: .; Approved: CL; M_PN: ANY; level: 1; ModifyDate: 02/22/12; MFGR: ANY; item_number: RK35-R0274
footprint RES-0402-N (0402 Footprint)
pins: 1, 2

## RK35-R0549
designator R?, comment value 5.49  (hidden comment: 5.49 Ohms;.06W;1%;±200PPM;CHIP RES;0402)
G_PN: RK35-R0549; NoLoad: .; Approved: CL; M_PN: ANY; level: 1; ModifyDate: 07/30/12; MFGR: ANY; item_number: RK35-R0549
footprint RES-0402-N (0402 Footprint)
pins: 1, 2

## RK36-21000
designator R?, comment value 10.0K  (hidden comment: 10.0K Ohms;.06W;0.5%;±50PPM;CHIP RES;0402)
G_PN: RK36-21000; Approved: CL; NoLoad: .; MFGR: VISHAY-DALE; M_PN: CRCW040210K0DHEDP; level: 1; ModifyDate: 4/23/13; item_number: RK36-21000
footprint RES-0402-N (0402 Footprint)
pins: 1, 2

## RK40-00000
designator R?, comment value 0  (hidden comment: JUMPER;.05 OHMS MAX;1A MAX;0603)
NoLoad: .; MFGR: ANY; Approved: CL; G_PN: RK40-00000; level: 1; ModifyDate: 3/27/13; M_PN: ANY; item_number: RK40-00000
footprint RES-0603-N (0603 Footprint)
pins: 1, 2

## RK40-00100
designator R?, comment value 10  (hidden comment: 10.0 OHMS;.06W;1%;200PPM;FILM;CHIP;0603)
NoLoad: .; MFGR: ANY; Approved: CL; G_PN: RK40-00100; level: 1; ModifyDate: 4/4/12; M_PN: ANY; item_number: RK40-00100
footprint RES-0603-N (0603 Footprint)
pins: 1, 2

## RK40-00113
designator R?, comment value 11.3  (hidden comment: 11.3 OHM 1% FILM SMT)
NoLoad: .; MFGR: ANY; Approved: CL; G_PN: RK40-00113; level: 1; ModifyDate: 7/2/13; M_PN: ANY; item_number: RK40-00113
footprint RES-0603-N (0603 Footprint)
pins: 1, 2

## RK40-00150
designator R?, comment value 15  (hidden comment: 15.0 OHMS;.06W;1%;200PPM;FILM;CHIP;0603)
G_PN: RK40-00150; Approved: CL; NoLoad: .; M_PN: ANY; level: 1; ModifyDate: 7/30/13; MFGR: ANY; item_number: RK40-00150
footprint RES-0603-N
pins: 1, 2

## RK40-00162
designator R?, comment value 16.2  (hidden comment: 16.2 OHMS;.06W;1%;200PPM;FILM;CHIP;0603)
NoLoad: .; MFGR: ANY; Approved: NM; G_PN: RK40-00162; level: 1; ModifyDate: 11/20/12; M_PN: ANY; item_number: RK40-00162
footprint RES-0603-N (0603 Footprint)
pins: 1, 2

## RK40-00200
designator R?, comment value 20  (hidden comment: 20.0 OHMS;.06W;1%;200PPM;FILM;CHIP;0603)
NoLoad: .; MFGR: ANY; Approved: CL; G_PN: RK40-00200; level: 1; ModifyDate: 3/18/13; M_PN: ANY; item_number: RK40-00200
footprint RES-0603-N
pins: 1, 2

## RK40-00499
designator R?, comment value 49.9  (hidden comment: 49.9 OHMS; 1%; .1W; 100PPM; FILM; CHIP; 0603)
Approved: CL; G_PN: RK40-00499; NoLoad: .; MFGR: ANY; level: 1; ModifyDate: 4/4/12; M_PN: ANY; item_number: RK40-00499
footprint RES-0603-N (0603 Footprint)
pins: 1, 2

## RK40-01000
designator R?, comment value 100  (hidden comment: 100 OHMS; 1%; .1W; 100PPM; FILM; CHIP; 0603)
NoLoad: .; MFGR: ANY; Approved: CL; G_PN: RK40-01000; level: 1; ModifyDate: 4/4/12; M_PN: ANY; item_number: RK40-01000
footprint RES-0603-N (0603 Footprint)
pins: 1, 2

## RK40-01300
designator R?, comment value 130  (hidden comment: 130 OHMS;.1W;1%;200PPM;FILM;CHIP;0603)
NoLoad: .; MFGR: VENKEL; M_PN: CR0603-10W-1300FT; Approved: CL; G_PN: RK40-01300; level: 1; ModifyDate: 3/27/13; item_number: RK40-01300
footprint RES-0603-N (0603 Footprint)
pins: 1, 2
